# Altium schematic symbol library FPGA_Xilinx_Virtex6.SchLib: 28 symbols (part 5 of 15)
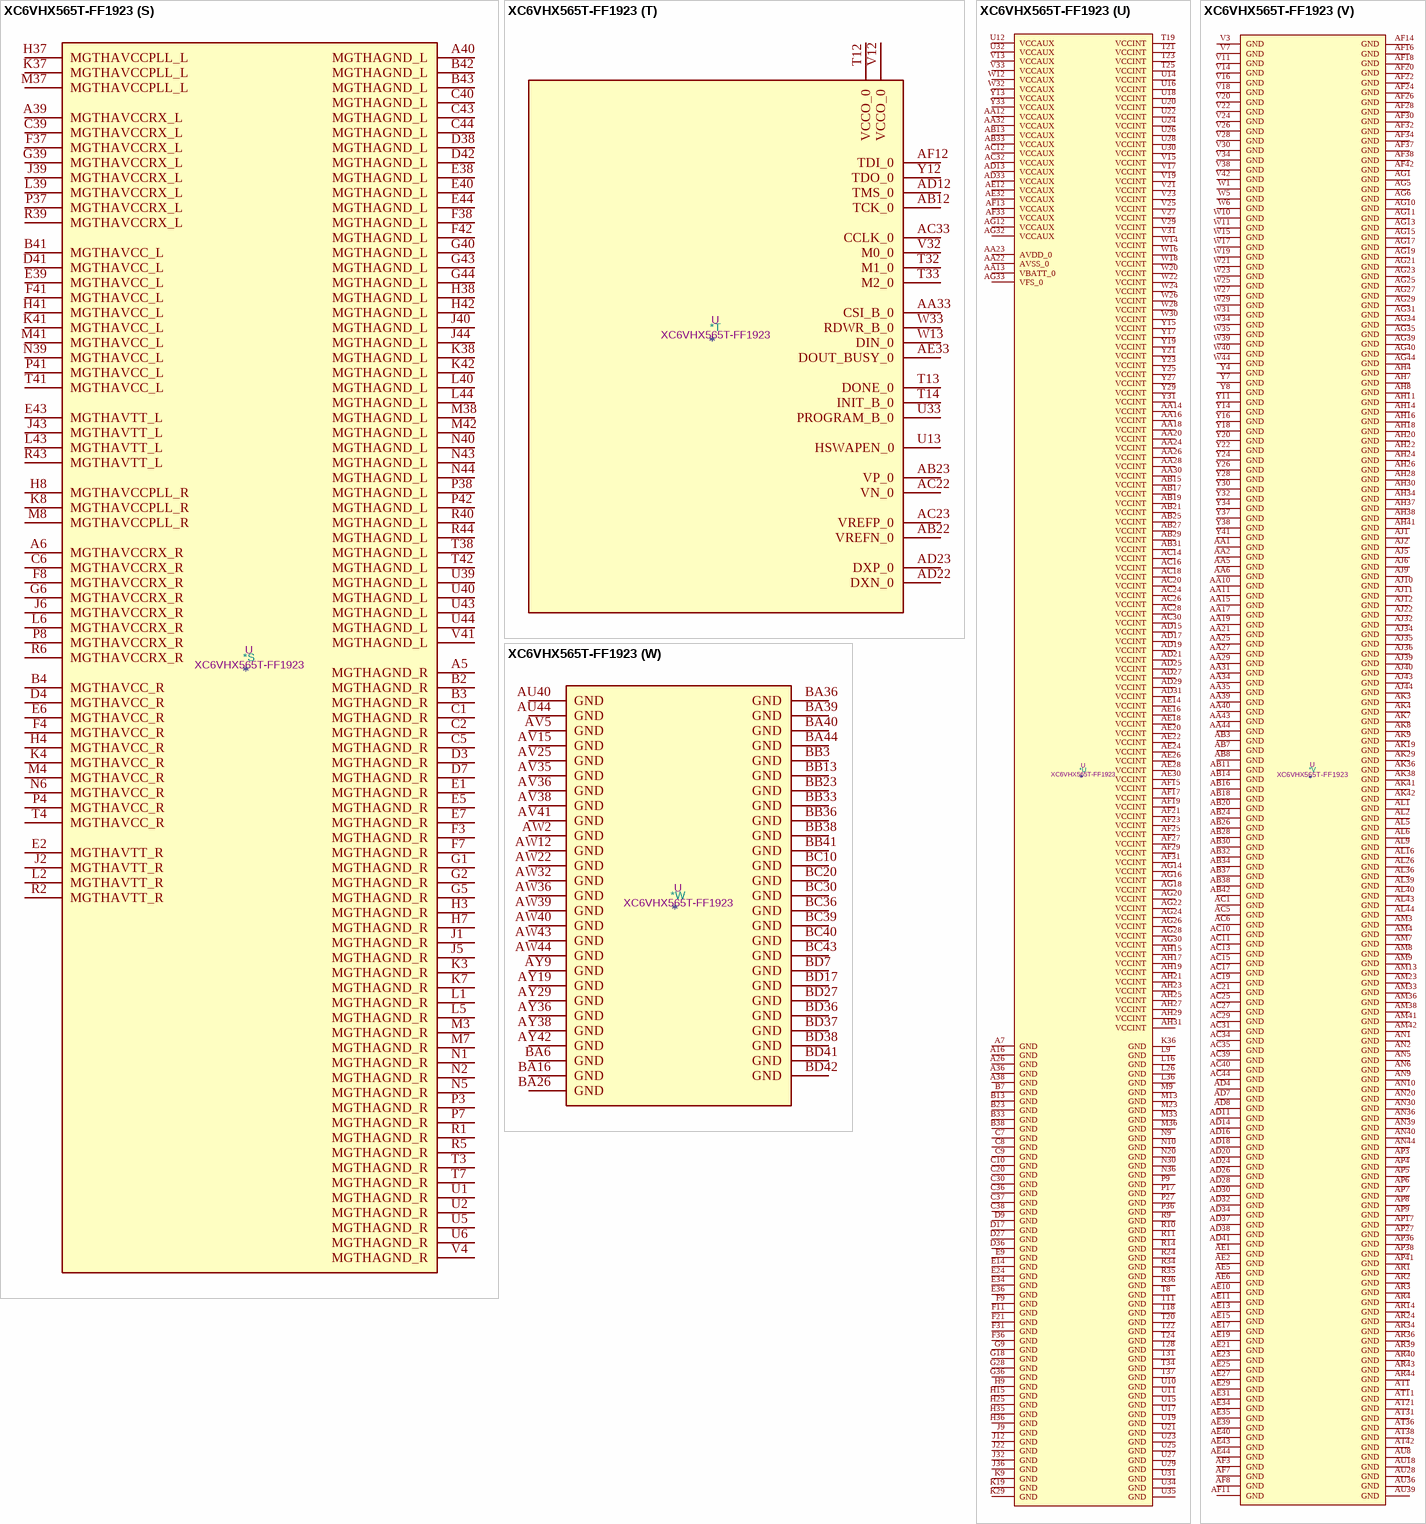
[diagram p105: symbol XC6VHX565T-FF1923]

## XC6VHX565T-FF1923
designator *  value XC6VHX565T-FF1923  Reference: U
ki_keywords: FPGA; ki_description: Virtex 6 HXT 565 XC6VHX565T-FF1923
part A pins: AJ23 IO_L3P_21, AK22 IO_L6P_21, AK23 IO_L3N_21, AK24 VCCO_21, AL22 IO_L9P_MRCC_21, AL23 IO_L6N_21, AL24 IO_L15P_21, AL25 IO_L13P_21, AM22 IO_L9N_MRCC_21, AM24 IO_L15N_21, AM25 IO_L13N_21, AM26 IO_L1P_21, AN22 IO_L18N_20, AN23 IO_L18P_20, AN24 IO_L18P_21, AN25 VCCO_21, AN26 IO_L1N_21, AP22 VCCO_20, AP23 IO_L15P_20, AP24 IO_L18N_21, AP25 IO_L12P_VRN_21, AP26 IO_L8P_SRCC_21, AR21 IO_L9N_MRCC_20, AR22 IO_L9P_MRCC_20, AR23 IO_L15N_20, AR25 IO_L12N_VRP_21, AR26 IO_L8N_SRCC_21, AT20 IO_L12P_VRN_20, AT22 IO_L3N_20, AT23 IO_L3P_20, AT24 IO_L17P_21, AT25 IO_L0P_21, AT26 VCCO_21, AU20 IO_L12N_VRP_20, AU21 IO_L19P_20, AU22 IO_L6P_20, AU23 VCCO_20, AU24 IO_L17N_21, AU25 IO_L0N_21, AU26 IO_L5P_21, AV19 IO_L7P_20, AV20 VCCO_20, AV21 IO_L19N_20, AV22 IO_L6N_20, AV23 IO_L16P_20, AV24 IO_L10P_MRCC_21, AV26 IO_L5N_21, AW19 IO_L7N_20, AW20 IO_L13P_20, AW21 IO_L17P_20, AW23 IO_L16N_20, AW24 IO_L10N_MRCC_21, AW25 IO_L7P_21, AW26 IO_L2P_21, AY20 IO_L13N_20, AY21 IO_L17N_20, AY22 IO_L10P_MRCC_20, AY23 IO_L14P_20, AY24 VCCO_21, AY25 IO_L7N_21, AY26 IO_L2N_21, BA19 IO_L5P_20, BA20 IO_L11P_SRCC_20, BA21 VCCO_20, BA22 IO_L10N_MRCC_20, BA23 IO_L14N_VREF_20, BA24 IO_L19P_21, BA25 IO_L4P_21, BB19 IO_L5N_20, BB20 IO_L11N_SRCC_20, BB21 IO_L2P_20, BB22 IO_L8P_SRCC_20, BB24 IO_L19N_21, BB25 IO_L4N_VREF_21, BB26 IO_L11P_SRCC_21, BC19 IO_L1P_20, BC21 IO_L2N_20, BC22 IO_L8N_SRCC_20, BC23 IO_L4P_20, BC24 IO_L16P_21, BC25 VCCO_21, BC26 IO_L11N_SRCC_21, BD19 IO_L1N_20, BD20 IO_L0N_20, BD21 IO_L0P_20, BD22 VCCO_20, BD23 IO_L4N_VREF_20, BD24 IO_L16N_21, BD25 IO_L14P_21, BD26 IO_L14N_VREF_21
part B pins: AJ24 IO_L18P_22, AJ25 IO_L12P_VRN_22, AJ26 IO_L9P_MRCC_22, AJ27 VCCO_22, AJ28 IO_L3P_22, AJ29 IO_L9P_MRCC_23, AJ30 IO_L3P_23, AJ31 IO_L3N_23, AK25 IO_L18N_22, AK26 IO_L12N_VRP_22, AK27 IO_L9N_MRCC_22, AK28 IO_L3N_22, AK30 IO_L9N_MRCC_23, AK31 IO_L6P_23, AL27 IO_L6P_22, AL28 IO_L6N_22, AL29 IO_L18P_23, AL30 IO_L15P_23, AL31 VCCO_23, AL32 IO_L6N_23, AM27 IO_L15P_22, AM28 VCCO_22, AM29 IO_L18N_23, AM30 IO_L15N_23, AM31 IO_L12P_VRN_23, AM32 IO_L12N_VRP_23, AN27 IO_L15N_22, AN28 IO_L1P_22, AN29 IO_L0P_22, AN31 IO_L0P_23, AN32 IO_L0N_23, AP28 IO_L1N_22, AP29 IO_L0N_22, AP30 IO_L5P_23, AP31 IO_L1P_23, AP32 VCCO_23, AR27 IO_L7P_22, AR28 IO_L4P_22, AR29 VCCO_22, AR30 IO_L5N_23, AR31 IO_L7P_23, AR32 IO_L1N_23, AT27 IO_L7N_22, AT28 IO_L4N_VREF_22, AT29 IO_L5P_22, AT30 IO_L4P_23, AT32 IO_L7N_23, AU27 IO_L10P_MRCC_22, AU29 IO_L5N_22, AU30 IO_L4N_VREF_23, AU31 IO_L11P_SRCC_23, AU32 IO_L2P_23, AV27 IO_L10N_MRCC_22, AV28 IO_L11P_SRCC_22, AV29 IO_L2P_22, AV30 VCCO_23, AV31 IO_L11N_SRCC_23, AV32 IO_L2N_23, AW27 VCCO_22, AW28 IO_L11N_SRCC_22, AW29 IO_L2N_22, AW30 IO_L17P_23, AW31 IO_L8P_SRCC_23, AY27 IO_L17P_22, AY28 IO_L8P_SRCC_22, AY30 IO_L17N_23, AY31 IO_L8N_SRCC_23, AY32 IO_L13P_23, BA27 IO_L17N_22, BA28 IO_L8N_SRCC_22, BA29 IO_L13P_22, BA30 IO_L10P_MRCC_23, BA31 VCCO_23, BA32 IO_L13N_23, BB27 IO_L16P_22, BB28 VCCO_22, BB29 IO_L13N_22, BB30 IO_L10N_MRCC_23, BB31 IO_L19P_23, BB32 IO_L14P_23, BC27 IO_L16N_22, BC28 IO_L19P_22, BC29 IO_L14P_22, BC31 IO_L19N_23, BC32 IO_L14N_VREF_23, BD28 IO_L19N_22, BD29 IO_L14N_VREF_22, BD30 IO_L16P_23, BD31 IO_L16N_23, BD32 VCCO_23
part C pins: A34 IO_L0P_25, A35 IO_L0N_25, A37 IO_L2N_SM8N_25, AH32 IO_L3P_D13_24, AH33 IO_L3N_D12_24, AJ33 IO_L6P_D7_24, AK32 IO_L18P_24, AK33 IO_L6N_D6_24, AK34 VCCO_24, AK35 IO_L9P_MRCC_24, AL33 IO_L18N_24, AL34 IO_L12P_D3_24, AL35 IO_L9N_MRCC_24, AM34 IO_L15P_FWE_B_24, AM35 IO_L12N_D2_FS2_24, AN33 IO_L0P_GC_24, AN34 IO_L15N_RS1_24, AN35 VCCO_24, AP33 IO_L1P_GC_24, AP34 IO_L0N_GC_24, AP35 IO_L2P_D15_24, AR33 IO_L1N_GC_24, AR35 IO_L2N_D14_24, AT33 IO_L5P_D9_24, AT34 IO_L5N_D8_24, AT35 IO_L4P_D11_24, AU33 VCCO_24, AU34 IO_L7P_D5_24, AU35 IO_L4N_VREF_D10_24, AV33 IO_L8P_SRCC_24, AV34 IO_L7N_D4_24, AW33 IO_L10P_MRCC_24, AW34 IO_L8N_SRCC_24, AW35 IO_L11P_SRCC_24, AY33 IO_L10N_MRCC_24, AY34 VCCO_24, AY35 IO_L11N_SRCC_24, B34 IO_L7N_SM12N_25, B35 IO_L1P_25, B36 IO_L1N_25, B37 IO_L2P_SM8P_25, BA33 IO_L17P_VRN_24, BA34 IO_L17N_VRP_24, BA35 IO_L13P_D1_FS1_24, BB34 IO_L14P_FCS_B_24, BB35 IO_L13N_D0_FS0_24, BC33 IO_L19P_24, BC34 IO_L14N_VREF_FOE_B_MOSI_24, BC35 VCCO_24, BD33 IO_L19N_24, BD34 IO_L16P_RS0_24, BD35 IO_L16N_CSO_B_24, C34 IO_L7P_SM12P_25, C35 VCCO_25, D33 IO_L8P_SRCC_25, D34 IO_L8N_SRCC_25, D35 IO_L5N_SM10N_25, E33 IO_L13N_SM14N_25, E35 IO_L5P_SM10P_25, F33 IO_L13P_SM14P_25, F34 IO_L14N_VREF_25, F35 IO_L11N_SRCC_25, G33 VCCO_25, G34 IO_L14P_25, G35 IO_L11P_SRCC_25, H33 IO_L19N_GC_25, H34 IO_L17N_25, J33 IO_L19P_GC_25, J34 IO_L17P_25, J35 IO_L6N_SM11N_25, K33 IO_L3N_SM9N_25, K34 VCCO_25, K35 IO_L6P_SM11P_25, L33 IO_L3P_SM9P_25, L34 IO_L16N_VRP_25, L35 IO_L10N_MRCC_25, M34 IO_L16P_VRN_25, M35 IO_L10P_MRCC_25, N32 IO_L12N_SM13N_25, N33 IO_L9P_MRCC_25, N34 IO_L9N_MRCC_25, N35 VCCO_25, P31 IO_L12P_SM13P_25, P32 VCCO_25, P33 IO_L15N_SM15N_25, P34 IO_L4P_25, P35 IO_L4N_VREF_25, R31 IO_L18P_GC_25, R32 IO_L18N_GC_25, R33 IO_L15P_SM15P_25
part D pins: A27 IO_L0N_27, A28 IO_L1P_27, A29 IO_L1N_27, A30 IO_L1N_26, A31 VCCO_26, A32 IO_L0N_26, A33 IO_L5N_26, B27 IO_L0P_27, B28 VCCO_27, B29 IO_L5N_27, B30 IO_L1P_26, B31 IO_L0P_26, B32 IO_L5P_26, C27 IO_L2P_27, C28 IO_L2N_27, C29 IO_L5P_27, C31 IO_L7N_26, C32 IO_L2P_26, C33 IO_L2N_26, D28 IO_L8P_SRCC_27, D29 IO_L8N_SRCC_27, D30 IO_L4N_VREF_26, D31 IO_L7P_26, D32 VCCO_26, E27 IO_L4N_VREF_27, E28 IO_L7N_27, E29 VCCO_27, E30 IO_L4P_26, E31 IO_L11P_SRCC_26, E32 IO_L11N_SRCC_26, F27 IO_L4P_27, F28 IO_L7P_27, F29 IO_L10N_MRCC_27, F30 IO_L13N_26, F32 IO_L8N_SRCC_26, G27 IO_L11N_SRCC_27, G29 IO_L10P_MRCC_27, G30 IO_L13P_26, G31 IO_L8P_SRCC_26, G32 IO_L17N_26, H27 IO_L11P_SRCC_27, H28 IO_L17P_27, H29 IO_L17N_27, H30 VCCO_26, H31 IO_L17P_26, H32 IO_L10N_MRCC_26, J27 VCCO_27, J28 IO_L19P_27, J29 IO_L19N_27, J30 IO_L19N_26, J31 IO_L10P_MRCC_26, K26 IO_L13P_27, K27 IO_L13N_27, K28 IO_L14N_VREF_27, K30 IO_L19P_26, K31 IO_L14N_VREF_26, K32 IO_L16N_26, L27 IO_L14P_27, L28 IO_L16P_27, L29 IO_L16N_27, L30 IO_L14P_26, L31 VCCO_26, L32 IO_L16P_26, M26 IO_L3N_27, M27 IO_L6N_27, M28 VCCO_27, M29 IO_L6N_26, M30 IO_L3P_26, M31 IO_L3N_26, M32 IO_L12N_VRP_26, N26 IO_L3P_27, N27 IO_L6P_27, N28 IO_L15N_27, N29 IO_L6P_26, N31 IO_L12P_VRN_26, P25 IO_L9N_MRCC_27, P26 IO_L12N_VRP_27, P28 IO_L15P_27, P29 IO_L9N_MRCC_26, P30 IO_L15N_26, R25 IO_L9P_MRCC_27, R26 IO_L12P_VRN_27, R27 IO_L18N_27, R28 IO_L9P_MRCC_26, R29 VCCO_26, R30 IO_L15P_26, T26 VCCO_27, T27 IO_L18P_27, T29 IO_L18P_26, T30 IO_L18N_26
part E pins: A23 IO_L8P_SRCC_28, A24 IO_L8N_SRCC_28, A25 IO_L7N_28, AP19 IO_L3N_30, AP20 IO_L3P_30, AP21 IO_L6P_30, AR18 IO_L0P_30, AR19 VCCO_30, AR20 IO_L6N_30, AT17 IO_L9P_MRCC_30, AT18 IO_L0N_30, AT19 IO_L1P_30, AU16 IO_L9N_MRCC_30, AU17 IO_L2P_30, AU19 IO_L1N_30, AV16 IO_L12P_VRN_30, AV17 IO_L2N_30, AV18 IO_L5P_30, AW16 IO_L12N_VRP_30, AW17 VCCO_30, AW18 IO_L5N_30, AY16 IO_L15N_30, AY17 IO_L15P_30, AY18 IO_L7P_30, B24 IO_L5N_28, B25 IO_L7P_28, B26 IO_L2N_28, BA17 IO_L4P_30, BA18 IO_L7N_30, BB12 IO_L8P_SRCC_30, BB14 IO_L18P_30, BB15 IO_L11N_SRCC_30, BB16 IO_L11P_SRCC_30, BB17 IO_L4N_VREF_30, BB18 VCCO_30, BC11 IO_L8N_SRCC_30, BC12 IO_L10N_MRCC_30, BC13 IO_L10P_MRCC_30, BC14 IO_L18N_30, BC15 VCCO_30, BC16 IO_L17P_30, BC17 IO_L16P_30, BC18 IO_L19P_30, BD10 IO_L13N_30, BD11 IO_L13P_30, BD12 VCCO_30, BD13 IO_L14N_VREF_30, BD14 IO_L14P_30, BD15 IO_L17N_30, BD16 IO_L16N_30, BD18 IO_L19N_30, C23 IO_L5P_28, C24 IO_L4N_VREF_28, C25 VCCO_28, C26 IO_L2P_28, D23 IO_L4P_28, D24 IO_L1N_28, D25 IO_L10N_MRCC_28, D26 IO_L11N_SRCC_28, E23 IO_L1P_28, E25 IO_L10P_MRCC_28, E26 IO_L11P_SRCC_28, F23 IO_L0P_28, F24 IO_L0N_28, F25 IO_L17N_28, F26 VCCO_28, G23 VCCO_28, G24 IO_L17P_28, G25 IO_L14P_28, G26 IO_L14N_VREF_28, H23 IO_L13N_28, H24 IO_L16N_28, H26 IO_L19N_28, J23 IO_L13P_28, J24 IO_L16P_28, J25 IO_L12N_VRP_28, J26 IO_L19P_28, K23 IO_L3N_28, K24 VCCO_28, K25 IO_L12P_VRN_28, L23 IO_L3P_28, L24 IO_L6P_28, L25 IO_L6N_28, M24 IO_L9P_MRCC_28, M25 IO_L9N_MRCC_28, N23 IO_L18P_28, N24 IO_L18N_28, N25 VCCO_28, P23 IO_L15P_28, P24 IO_L15N_28
part F pins: AJ18 IO_L6P_31, AJ19 IO_L9N_MRCC_31, AJ20 IO_L9P_MRCC_31, AJ21 IO_L3P_31, AK18 IO_L6N_31, AK20 IO_L12P_VRN_31, AK21 IO_L3N_31, AL18 IO_L1P_31, AL19 IO_L12N_VRP_31, AL20 IO_L15P_31, AL21 VCCO_31, AM17 IO_L1N_31, AM18 VCCO_31, AM19 IO_L5P_31, AM20 IO_L15N_31, AM21 IO_L18P_31, AN16 IO_L0P_31, AN17 IO_L4N_VREF_31, AN18 IO_L4P_31, AN19 IO_L5N_31, AN21 IO_L18N_31, AP15 IO_L0N_31, AP16 IO_L2P_31, AP18 IO_L7P_31, AR15 IO_L8P_SRCC_31, AR16 IO_L2N_31, AR17 IO_L7N_31, AT13 IO_L10N_MRCC_31, AT14 IO_L10P_MRCC_31, AT15 IO_L8N_SRCC_31, AT16 VCCO_31, AU13 VCCO_31, AU14 IO_L14P_31, AU15 IO_L11P_SRCC_31, AV13 IO_L14N_VREF_31, AV14 IO_L11N_SRCC_31, AW1 IO_L19P_32, AW5 IO_L7P_32, AW13 IO_L16P_31, AW14 IO_L13N_31, AW15 IO_L13P_31, AY1 IO_L19N_32, AY2 IO_L17P_32, AY3 IO_L13P_32, AY4 VCCO_32, AY5 IO_L7N_32, AY10 IO_L1P_32, AY11 IO_L4N_VREF_32, AY12 IO_L4P_32, AY13 IO_L16N_31, AY14 VCCO_31, AY15 IO_L19P_31, BA1 VCCO_32, BA2 IO_L17N_32, BA3 IO_L13N_32, BA4 IO_L11N_SRCC_32, BA5 IO_L11P_SRCC_32, BA7 IO_L5N_32, BA8 IO_L5P_32, BA9 IO_L1N_32, BA10 IO_L0P_32, BA11 VCCO_32, BA12 IO_L6P_32, BA13 IO_L17N_31, BA14 IO_L17P_31, BA15 IO_L19N_31, BB1 IO_L16N_32, BB2 IO_L16P_32, BB4 IO_L8N_SRCC_32, BB5 IO_L8P_SRCC_32, BB6 IO_L2N_32, BB7 IO_L2P_32, BB8 VCCO_32, BB9 IO_L0N_32, BB10 IO_L3P_32, BB11 IO_L6N_32, BC2 IO_L14N_VREF_32, BC3 IO_L14P_32, BC4 IO_L15P_32, BC5 VCCO_32, BC6 IO_L9P_MRCC_32, BC7 IO_L10N_MRCC_32, BC8 IO_L10P_MRCC_32, BC9 IO_L3N_32, BD3 IO_L15N_32, BD4 IO_L18N_32, BD5 IO_L18P_32, BD6 IO_L9N_MRCC_32, BD8 IO_L12N_VRP_32, BD9 IO_L12P_VRN_32
part G pins: AH12 IO_L3N_A12_D28_34, AH13 IO_L3P_A13_D29_34, AJ13 IO_L6N_A06_D22_34, AJ14 IO_L6P_A07_D23_34, AJ15 IO_L3N_33, AJ16 IO_L3P_33, AJ17 VCCO_33, AK10 IO_L2N_A14_D30_34, AK11 IO_L2P_A15_D31_34, AK12 IO_L0N_GC_34, AK13 IO_L0P_GC_34, AK14 VCCO_34, AK15 IO_L1P_33, AK16 IO_L2N_33, AK17 IO_L2P_33, AL10 IO_L4P_A11_D27_34, AL11 VCCO_34, AL12 IO_L1N_GC_34, AL13 IO_L1P_GC_34, AL14 IO_L0P_33, AL15 IO_L1N_33, AL17 IO_L16P_33, AM10 IO_L4N_VREF_A10_D26_34, AM11 IO_L5N_A08_D24_34, AM12 IO_L5P_A09_D25_34, AM14 IO_L0N_33, AM15 IO_L6P_33, AM16 IO_L16N_33, AN11 IO_L8P_SRCC_34, AN12 IO_L5N_33, AN13 IO_L5P_33, AN14 IO_L6N_33, AN15 VCCO_33, AP10 IO_L8N_SRCC_34, AP11 IO_L7P_33, AP12 VCCO_33, AP13 IO_L9P_MRCC_33, AP14 IO_L12P_VRN_33, AR5 IO_L12P_A03_D19_34, AR6 IO_L9N_MRCC_34, AR7 IO_L9P_MRCC_34, AR8 IO_L10P_MRCC_34, AR9 VCCO_34, AR10 IO_L19P_VRN_34, AR11 IO_L7N_33, AR12 IO_L9N_MRCC_33, AR13 IO_L12N_VRP_33, AT2 IO_L15N_A22_34, AT3 IO_L15P_A23_34, AT4 IO_L12N_A02_D18_34, AT5 IO_L14P_A25_34, AT6 VCCO_34, AT7 IO_L10N_MRCC_34, AT8 IO_L7N_A04_D20_34, AT9 IO_L7P_A05_D21_34, AT10 IO_L19N_VRP_34, AT12 IO_L19P_33, AU1 IO_L13N_A00_D16_34, AU2 IO_L13P_A01_D17_34, AU3 VCCO_34, AU4 IO_L14N_VREF_A24_34, AU5 IO_L11N_SRCC_34, AU6 IO_L11P_SRCC_34, AU7 IO_L15P_33, AU9 IO_L4P_33, AU10 IO_L10N_MRCC_33, AU11 IO_L10P_MRCC_33, AU12 IO_L19N_33, AV1 IO_L16N_A20_34, AV2 IO_L16P_A21_34, AV3 IO_L18N_A16_34, AV4 IO_L18P_A17_34, AV6 IO_L15N_33, AV7 IO_L8P_SRCC_33, AV8 IO_L4N_VREF_33, AV9 IO_L11P_SRCC_33, AV10 VCCO_33, AV11 IO_L14P_33, AV12 IO_L18P_33, AW3 IO_L17N_A18_34, AW4 IO_L17P_A19_34, AW6 IO_L8N_SRCC_33, AW7 VCCO_33, AW8 IO_L11N_SRCC_33, AW9 IO_L13P_33, AW10 IO_L14N_VREF_33, AW11 IO_L18N_33, AY6 IO_L17N_33, AY7 IO_L17P_33, AY8 IO_L13N_33
part H pins: A8 IO_L4N_VREF_35, A9 IO_L7N_SM4N_35, A10 IO_L2N_SM0N_35, A11 VCCO_35, A12 IO_L1N_35, A13 IO_L1P_35, A14 IO_L5N_36, A15 IO_L1N_36, A17 IO_L0N_36, B8 VCCO_35, B9 IO_L4P_35, B10 IO_L7P_SM4P_35, B11 IO_L2P_SM0P_35, B12 IO_L5N_SM2N_35, B14 IO_L5P_36, B15 IO_L1P_36, B16 IO_L2N_36, B17 IO_L0P_36, C11 IO_L0N_35, C12 IO_L0P_35, C13 IO_L5P_SM2P_35, C14 IO_L4N_VREF_36, C15 VCCO_36, C16 IO_L2P_36, D10 IO_L14N_VREF_35, D11 IO_L8N_SRCC_35, D12 VCCO_35, D13 IO_L17N_36, D14 IO_L4P_36, D15 IO_L11N_SRCC_36, D16 IO_L7N_36, E10 IO_L13N_SM6N_35, E11 IO_L14P_35, E12 IO_L8P_SRCC_35, E13 IO_L17P_36, E15 IO_L11P_SRCC_36, E16 IO_L7P_36, F10 IO_L13P_SM6P_35, F12 IO_L10N_MRCC_35, F13 IO_L6N_36, F14 IO_L6P_36, F15 IO_L3N_36, F16 VCCO_36, G10 IO_L6N_SM3N_35, G11 IO_L17N_35, G12 IO_L10P_MRCC_35, G13 VCCO_36, G14 IO_L13N_36, G15 IO_L3P_36, H10 VCCO_35, H11 IO_L6P_SM3P_35, H12 IO_L17P_35, H13 IO_L8N_SRCC_36, H14 IO_L13P_36, J10 IO_L11N_SRCC_35, J11 IO_L9N_MRCC_35, J13 IO_L14N_VREF_36, J14 IO_L8P_SRCC_36, J15 IO_L19N_36, K10 IO_L11P_SRCC_35, K11 IO_L9P_MRCC_35, K12 IO_L16N_VRP_35, K13 IO_L14P_36, K14 VCCO_36, K15 IO_L19P_36, L10 IO_L15N_SM7N_35, L11 VCCO_35, L12 IO_L16P_VRN_35, L13 IO_L18N_36, L14 IO_L18P_36, L15 IO_L16N_36, M10 IO_L18N_GC_35, M11 IO_L15P_SM7P_35, M12 IO_L19N_GC_35, M14 IO_L12N_VRP_36, M15 IO_L16P_36, N11 IO_L18P_GC_35, N12 IO_L19P_GC_35, N13 IO_L10N_MRCC_36, N14 IO_L12P_VRN_36, N15 VCCO_36, P10 IO_L12N_SM5N_35, P11 IO_L12P_SM5P_35, P12 VCCO_35, P13 IO_L10P_MRCC_36, P14 IO_L9N_MRCC_36, P15 IO_L9P_MRCC_36, R12 IO_L3N_SM1N_35, R13 IO_L3P_SM1P_35, R15 IO_L15N_36, T15 IO_L15P_36
part I pins: A18 IO_L4N_VREF_38, A19 IO_L5N_38, A20 IO_L8N_SRCC_38, A21 VCCO_38, A22 IO_L7N_38, B18 VCCO_38, B19 IO_L4P_38, B20 IO_L5P_38, B21 IO_L8P_SRCC_38, B22 IO_L7P_38, C17 IO_L5N_37, C18 IO_L5P_37, C19 IO_L1N_37, C21 IO_L1N_38, C22 IO_L1P_38, D18 IO_L2N_37, D19 IO_L1P_37, D20 IO_L11N_SRCC_38, D21 IO_L2N_38, D22 VCCO_38, E17 IO_L4N_VREF_37, E18 IO_L2P_37, E19 VCCO_37, E20 IO_L16N_38, E21 IO_L11P_SRCC_38, E22 IO_L2P_38, F17 IO_L4P_37, F18 IO_L7N_37, F19 IO_L7P_37, F20 IO_L16P_38, F22 IO_L13N_38, G16 IO_L13N_37, G17 IO_L8N_SRCC_37, G19 IO_L0N_37, G20 IO_L17N_38, G21 IO_L10N_MRCC_38, G22 IO_L13P_38, H16 IO_L14N_VREF_37, H17 IO_L13P_37, H18 IO_L8P_SRCC_37, H19 IO_L0P_37, H20 VCCO_38, H21 IO_L17P_38, H22 IO_L10P_MRCC_38, J16 IO_L14P_37, J17 VCCO_37, J18 IO_L11N_SRCC_37, J19 IO_L11P_SRCC_37, J20 IO_L19N_38, J21 IO_L0N_38, K16 IO_L17N_37, K17 IO_L17P_37, K18 IO_L10N_MRCC_37, K20 IO_L14N_VREF_38, K21 IO_L19P_38, K22 IO_L0P_38, L17 IO_L18N_37, L18 IO_L10P_MRCC_37, L19 IO_L3N_37, L20 IO_L14P_38, L21 VCCO_38, L22 IO_L3N_38, M16 IO_L16N_37, M17 IO_L18P_37, M18 VCCO_37, M19 IO_L3P_37, M20 IO_L6N_38, M21 IO_L6P_38, M22 IO_L3P_38, N16 IO_L16P_37, N17 IO_L12N_VRP_37, N18 IO_L12P_VRN_37, N19 IO_L6N_37, N21 IO_L9N_MRCC_38, N22 IO_L9P_MRCC_38, P16 IO_L19N_37, P18 IO_L9N_MRCC_37, P19 IO_L6P_37, P20 IO_L12N_VRP_38, P21 IO_L18N_38, P22 VCCO_38, R16 IO_L19P_37, R17 IO_L15N_37, R18 IO_L9P_MRCC_37, R19 VCCO_37, R20 IO_L12P_VRN_38, R21 IO_L18P_38, R22 IO_L15N_38, R23 IO_L15P_38, T16 VCCO_37, T17 IO_L15P_37
part J pins: AP39 MGTRXN3_101, AP40 MGTRXP3_101, AP43 MGTTXN3_101, AP44 MGTTXP3_101, AR37 MGTREFCLK1P_101, AR38 MGTREFCLK1N_101, AR41 MGTTXN2_101, AR42 MGTTXP2_101, AT39 MGTRXN2_101, AT40 MGTRXP2_101, AT43 MGTTXN1_101, AT44 MGTTXP1_101, AU37 MGTREFCLK0P_101, AU38 MGTREFCLK0N_101, AU41 MGTTXN0_101, AU42 MGTTXP0_101, AV39 MGTRXN1_101, AV40 MGTRXP1_101, AV43 MGTTXN3_100, AV44 MGTTXP3_100, AW37 MGTREFCLK1P_100, AW38 MGTREFCLK1N_100, AW41 MGTTXN2_100, AW42 MGTTXP2_100, AY39 MGTRXN0_101, AY40 MGTRXP0_101, AY43 MGTTXN1_100, AY44 MGTTXP1_100, BA37 MGTREFCLK0P_100, BA38 MGTREFCLK0N_100, BA41 MGTRXN3_100, BA42 MGTRXP3_100, BB39 MGTRXN2_100, BB40 MGTRXP2_100, BB43 MGTTXN0_100, BB44 MGTTXP0_100, BC41 MGTRXN1_100, BC42 MGTRXP1_100, BD39 MGTRXN0_100, BD40 MGTRXP0_100
part K pins: AD35 MGTREFCLK1P_103, AD36 MGTREFCLK1N_103, AE37 MGTRXN3_103, AE38 MGTRXP3_103, AF35 MGTREFCLK0P_103, AF36 MGTREFCLK0N_103, AF39 MGTRXN2_103, AF40 MGTRXP2_103, AF43 MGTTXN3_103, AF44 MGTTXP3_103, AG37 MGTRXN1_103, AG38 MGTRXP1_103, AG41 MGTTXN2_103, AG42 MGTTXP2_103, AH35 MGTREFCLK1P_102, AH36 MGTREFCLK1N_102, AH39 MGTRXN0_103, AH40 MGTRXP0_103, AH43 MGTTXN1_103, AH44 MGTTXP1_103, AJ37 MGTRXN2_102, AJ38 MGTRXP2_102, AJ41 MGTTXN0_103, AJ42 MGTTXP0_103, AK39 MGTRXN3_102, AK40 MGTRXP3_102, AK43 MGTTXN3_102, AK44 MGTTXP3_102, AL37 MGTRXN0_102, AL38 MGTRXP0_102, AL41 MGTTXN2_102, AL42 MGTTXP2_102, AM39 MGTRXN1_102, AM40 MGTRXP1_102, AM43 MGTTXN1_102, AM44 MGTTXP1_102, AN37 MGTREFCLK0P_102, AN38 MGTREFCLK0N_102, AN41 MGTTXN0_102, AN42 MGTTXP0_102
part L pins: AA37 MGTRXN3_104, AA38 MGTRXP3_104, AA41 MGTTXN0_105, AA42 MGTTXP0_105, AB35 MGTREFCLK0P_104, AB36 MGTREFCLK0N_104, AB39 MGTRXN2_104, AB40 MGTRXP2_104, AB43 MGTTXN3_104, AB44 MGTTXP3_104, AC37 MGTRXN1_104, AC38 MGTRXP1_104, AC41 MGTTXN2_104, AC42 MGTTXP2_104, AD39 MGTRXN0_104, AD40 MGTRXP0_104, AD43 MGTTXN1_104, AD44 MGTTXP1_104, AE41 MGTTXN0_104, AE42 MGTTXP0_104, T35 MGTREFCLK1P_105, T36 MGTREFCLK1N_105, U37 MGTRXN3_105, U38 MGTRXP3_105, V35 MGTREFCLK0P_105, V36 MGTREFCLK0N_105, V39 MGTRXN2_105, V40 MGTRXP2_105, V43 MGTTXN3_105, V44 MGTTXP3_105, W37 MGTRXN1_105, W38 MGTRXP1_105, W41 MGTTXN2_105, W42 MGTTXP2_105, Y35 MGTREFCLK1P_104, Y36 MGTREFCLK1N_104, Y39 MGTRXN0_105, Y40 MGTRXP0_105, Y43 MGTTXN1_105, Y44 MGTTXP1_105
part M pins: E37 MGTRBIAS_107, G41 MGTTXP2_107, G42 MGTTXN2_107, H39 MGTRXP2_107, H40 MGTRXN2_107, H43 MGTTXP3_107, H44 MGTTXN3_107, J37 MGTRXP3_107, J38 MGTRXN3_107, J41 MGTREFCLKP_107, J42 MGTREFCLKN_107, K39 MGTRXP0_107, K40 MGTRXN0_107, K43 MGTTXP1_107, K44 MGTTXN1_107, L37 MGTRXP1_107, L38 MGTRXN1_107, L41 MGTTXP0_107, L42 MGTTXN0_107, M39 MGTRXP3_106, M40 MGTRXN3_106, M43 MGTTXP2_106, M44 MGTTXN2_106, N37 MGTRXP2_106, N38 MGTRXN2_106, N41 MGTTXP3_106, N42 MGTTXN3_106, P43 MGTTXP1_106, P44 MGTTXN1_106, R38 MGTRBIAS_106, R41 MGTREFCLKP_106, R42 MGTREFCLKN_106, T39 MGTRXP1_106, T40 MGTRXN1_106, T43 MGTTXP0_106, T44 MGTTXN0_106, U41 MGTRXP0_106, U42 MGTRXN0_106
part N pins: A41 MGTTXP2_108, A42 MGTTXN2_108, AH9 MGTREFCLK1N_112, AH10 MGTREFCLK1P_112, AJ7 MGTRXP2_112, AJ8 MGTRXN2_112, AK1 MGTTXP3_112, AK2 MGTTXN3_112, AK5 MGTRXP3_112, AK6 MGTRXN3_112, AL3 MGTTXP2_112, AL4 MGTTXN2_112, AL7 MGTRXP0_112, AL8 MGTRXN0_112, AM1 MGTTXP1_112, AM2 MGTTXN1_112, AM5 MGTRXP1_112, AM6 MGTRXN1_112, AN3 MGTTXP0_112, AN4 MGTTXN0_112, AN7 MGTREFCLK0N_112, AN8 MGTREFCLK0P_112, B39 MGTRXP2_108, B40 MGTRXN2_108, C41 MGTTXP3_108, C42 MGTTXN3_108, D37 MGTRBIAS_108, D39 MGTRXP3_108, D40 MGTRXN3_108, D43 MGTTXP1_108, D44 MGTTXN1_108, E41 MGTREFCLKP_108, E42 MGTREFCLKN_108, F39 MGTRXP1_108, F40 MGTRXN1_108, F43 MGTTXP0_108, F44 MGTTXN0_108, G37 MGTRXP0_108, G38 MGTRXN0_108
part O pins: AA7 MGTRXP3_114, AA8 MGTRXN3_114, AB1 MGTTXP3_114, AB2 MGTTXN3_114, AB5 MGTRXP2_114, AB6 MGTRXN2_114, AB9 MGTREFCLK0N_114, AB10 MGTREFCLK0P_114, AC3 MGTTXP2_114, AC4 MGTTXN2_114, AC7 MGTRXP1_114, AC8 MGTRXN1_114, AD1 MGTTXP1_114, AD2 MGTTXN1_114, AD5 MGTRXP0_114, AD6 MGTRXN0_114, AD9 MGTREFCLK1N_113, AD10 MGTREFCLK1P_113, AE3 MGTTXP0_114, AE4 MGTTXN0_114, AE7 MGTRXP3_113, AE8 MGTRXN3_113, AF1 MGTTXP3_113, AF2 MGTTXN3_113, AF5 MGTRXP2_113, AF6 MGTRXN2_113, AF9 MGTREFCLK0N_113, AF10 MGTREFCLK0P_113, AG3 MGTTXP2_113, AG4 MGTTXN2_113, AG7 MGTRXP1_113, AG8 MGTRXN1_113, AH1 MGTTXP1_113, AH2 MGTTXN1_113, AH5 MGTRXP0_113, AH6 MGTRXN0_113, AJ3 MGTTXP0_113, AJ4 MGTTXN0_113, Y9 MGTREFCLK1N_114, Y10 MGTREFCLK1P_114
part P pins: AA3 MGTTXP0_115, AA4 MGTTXN0_115, M1 MGTTXN2_116, M2 MGTTXP2_116, M5 MGTRXN3_116, M6 MGTRXP3_116, N3 MGTTXN3_116, N4 MGTTXP3_116, N7 MGTRXN2_116, N8 MGTRXP2_116, P1 MGTTXN1_116, P2 MGTTXP1_116, R3 MGTREFCLKN_116, R4 MGTREFCLKP_116, R7 MGTRBIAS_116, T1 MGTTXN0_116, T2 MGTTXP0_116, T5 MGTRXN1_116, T6 MGTRXP1_116, T9 MGTREFCLK1N_115, T10 MGTREFCLK1P_115, U3 MGTRXN0_116, U4 MGTRXP0_116, U7 MGTRXP3_115, U8 MGTRXN3_115, V1 MGTTXP3_115, V2 MGTTXN3_115, V5 MGTRXP2_115, V6 MGTRXN2_115, V9 MGTREFCLK0N_115, V10 MGTREFCLK0P_115, W3 MGTTXP2_115, W4 MGTTXN2_115, W7 MGTRXP1_115, W8 MGTRXN1_115, Y1 MGTTXP1_115, Y2 MGTTXN1_115, Y5 MGTRXP0_115, Y6 MGTRXN0_115
part Q pins: A3 MGTTXN2_118, A4 MGTTXP2_118, B5 MGTRXN2_118, B6 MGTRXP2_118, C3 MGTTXN3_118, C4 MGTTXP3_118, D1 MGTTXN1_118, D2 MGTTXP1_118, D5 MGTRXN3_118, D6 MGTRXP3_118, D8 MGTRBIAS_118, E3 MGTREFCLKN_118, E4 MGTREFCLKP_118, E8 MGTRBIAS_117, F1 MGTTXN0_118, F2 MGTTXP0_118, F5 MGTRXN1_118, F6 MGTRXP1_118, G3 MGTTXN2_117, G4 MGTTXP2_117, G7 MGTRXN0_118, G8 MGTRXP0_118, H1 MGTTXN3_117, H2 MGTTXP3_117, H5 MGTRXN2_117, H6 MGTRXP2_117, J3 MGTREFCLKN_117, J4 MGTREFCLKP_117, J7 MGTRXN3_117, J8 MGTRXP3_117, K1 MGTTXN1_117, K2 MGTTXP1_117, K5 MGTRXN0_117, K6 MGTRXP0_117, L3 MGTTXN0_117, L4 MGTTXP0_117, L7 MGTRXN1_117, L8 MGTRXP1_117
part R pins: AA9 MGTAVCC_RN, AA36 MGTAVCC_LN, AB4 MGTAVTT_RN, AB41 MGTAVTT_LN, AC2 MGTAVTT_RN, AC9 MGTAVCC_RN, AC36 MGTAVCC_LN, AC43 MGTAVTT_LN, AD3 MGTAVTT_RN, AD42 MGTAVTT_LN, AE9 MGTAVCC_RN, AE36 MGTAVCC_LN, AF4 MGTAVTT_RN, AF41 MGTAVTT_LN, AG2 MGTAVTT_RN, AG9 MGTAVCC_RN, AG36 MGTAVCC_LN, AG43 MGTAVTT_LN, AH3 MGTAVTT_RN, AH42 MGTAVTT_LN, AK37 MGTAVCC_LS, AM37 MGTAVCC_LS, AN43 MGTAVTT_LS, AP1 MGTRREF_115, AP2 MGTAVTTRCAL_115, AP37 MGTAVCC_LS, AP42 MGTAVTT_LS, AT37 MGTAVCC_LS, AT41 MGTAVTT_LS, AU43 MGTAVTT_LS, AV37 MGTAVCC_LS, AV42 MGTAVTT_LS, AY37 MGTAVCC_LS, AY41 MGTAVTT_LS, BA43 MGTAVTT_LS, BB37 MGTAVCC_LS, BB42 MGTAVTT_LS, BC37 MGTAVTTRCAL_105, BC38 MGTRREF_105, U9 MGTAVCC_RN, U36 MGTAVCC_LN, V8 MGTAVCC_RN, V37 MGTAVCC_LN, W2 MGTAVTT_RN, W9 MGTAVCC_RN, W36 MGTAVCC_LN, W43 MGTAVTT_LN, Y3 MGTAVTT_RN, Y42 MGTAVTT_LN
part S pins: A5 MGTHAGND_R, A6 MGTHAVCCRX_R, A39 MGTHAVCCRX_L, A40 MGTHAGND_L, B2 MGTHAGND_R, B3 MGTHAGND_R, B4 MGTHAVCC_R, B41 MGTHAVCC_L, B42 MGTHAGND_L, B43 MGTHAGND_L, C1 MGTHAGND_R, C2 MGTHAGND_R, C5 MGTHAGND_R, C6 MGTHAVCCRX_R, C39 MGTHAVCCRX_L, C40 MGTHAGND_L, C43 MGTHAGND_L, C44 MGTHAGND_L, D3 MGTHAGND_R, D4 MGTHAVCC_R, D7 MGTHAGND_R, D38 MGTHAGND_L, D41 MGTHAVCC_L, D42 MGTHAGND_L, E1 MGTHAGND_R, E2 MGTHAVTT_R, E5 MGTHAGND_R, E6 MGTHAVCC_R, E7 MGTHAGND_R, E38 MGTHAGND_L, E39 MGTHAVCC_L, E40 MGTHAGND_L, E43 MGTHAVTT_L, E44 MGTHAGND_L, F3 MGTHAGND_R, F4 MGTHAVCC_R, F7 MGTHAGND_R, F8 MGTHAVCCRX_R, F37 MGTHAVCCRX_L, F38 MGTHAGND_L, F41 MGTHAVCC_L, F42 MGTHAGND_L, G1 MGTHAGND_R, G2 MGTHAGND_R, G5 MGTHAGND_R, G6 MGTHAVCCRX_R, G39 MGTHAVCCRX_L, G40 MGTHAGND_L, G43 MGTHAGND_L, G44 MGTHAGND_L, H3 MGTHAGND_R, H4 MGTHAVCC_R, H7 MGTHAGND_R, H8 MGTHAVCCPLL_R, H37 MGTHAVCCPLL_L, H38 MGTHAGND_L, H41 MGTHAVCC_L, H42 MGTHAGND_L, J1 MGTHAGND_R, J2 MGTHAVTT_R, J5 MGTHAGND_R, J6 MGTHAVCCRX_R, J39 MGTHAVCCRX_L, J40 MGTHAGND_L, J43 MGTHAVTT_L, J44 MGTHAGND_L, K3 MGTHAGND_R, K4 MGTHAVCC_R, K7 MGTHAGND_R, K8 MGTHAVCCPLL_R, K37 MGTHAVCCPLL_L, K38 MGTHAGND_L, K41 MGTHAVCC_L, K42 MGTHAGND_L, L1 MGTHAGND_R, L2 MGTHAVTT_R, L5 MGTHAGND_R, L6 MGTHAVCCRX_R, L39 MGTHAVCCRX_L, L40 MGTHAGND_L, L43 MGTHAVTT_L, L44 MGTHAGND_L, M3 MGTHAGND_R, M4 MGTHAVCC_R, M7 MGTHAGND_R, M8 MGTHAVCCPLL_R, M37 MGTHAVCCPLL_L, M38 MGTHAGND_L, M41 MGTHAVCC_L, M42 MGTHAGND_L, N1 MGTHAGND_R, N2 MGTHAGND_R, N5 MGTHAGND_R, N6 MGTHAVCC_R, N39 MGTHAVCC_L, N40 MGTHAGND_L, N43 MGTHAGND_L, N44 MGTHAGND_L, P3 MGTHAGND_R, P4 MGTHAVCC_R, P7 MGTHAGND_R, P8 MGTHAVCCRX_R, P37 MGTHAVCCRX_L, P38 MGTHAGND_L, P41 MGTHAVCC_L, P42 MGTHAGND_L, R1 MGTHAGND_R, R2 MGTHAVTT_R, R5 MGTHAGND_R, R6 MGTHAVCCRX_R, R39 MGTHAVCCRX_L, R40 MGTHAGND_L, R43 MGTHAVTT_L, R44 MGTHAGND_L, T3 MGTHAGND_R, T4 MGTHAVCC_R, T7 MGTHAGND_R, T38 MGTHAGND_L, T41 MGTHAVCC_L, T42 MGTHAGND_L, U1 MGTHAGND_R, U2 MGTHAGND_R, U5 MGTHAGND_R, U6 MGTHAGND_R, U39 MGTHAGND_L, U40 MGTHAGND_L, U43 MGTHAGND_L, U44 MGTHAGND_L, V4 MGTHAGND_R, V41 MGTHAGND_L